# Altium footprint library 3.05-RJ11-RJ45-D_SUB-VGA-SCSI接口-网络变压器.PcbLib: 53 footprints (part 1 of 4)
Each footprint in its own frame and in the unit in brackets; x right, y up, seen from the top. Pads: shape width x height; smd on the part's side, far side on the other; paste and mask are expansions set on the pad; w line width, h text height; cw(c..) or ccw(c..) is an arc to the next point about the centre after c.
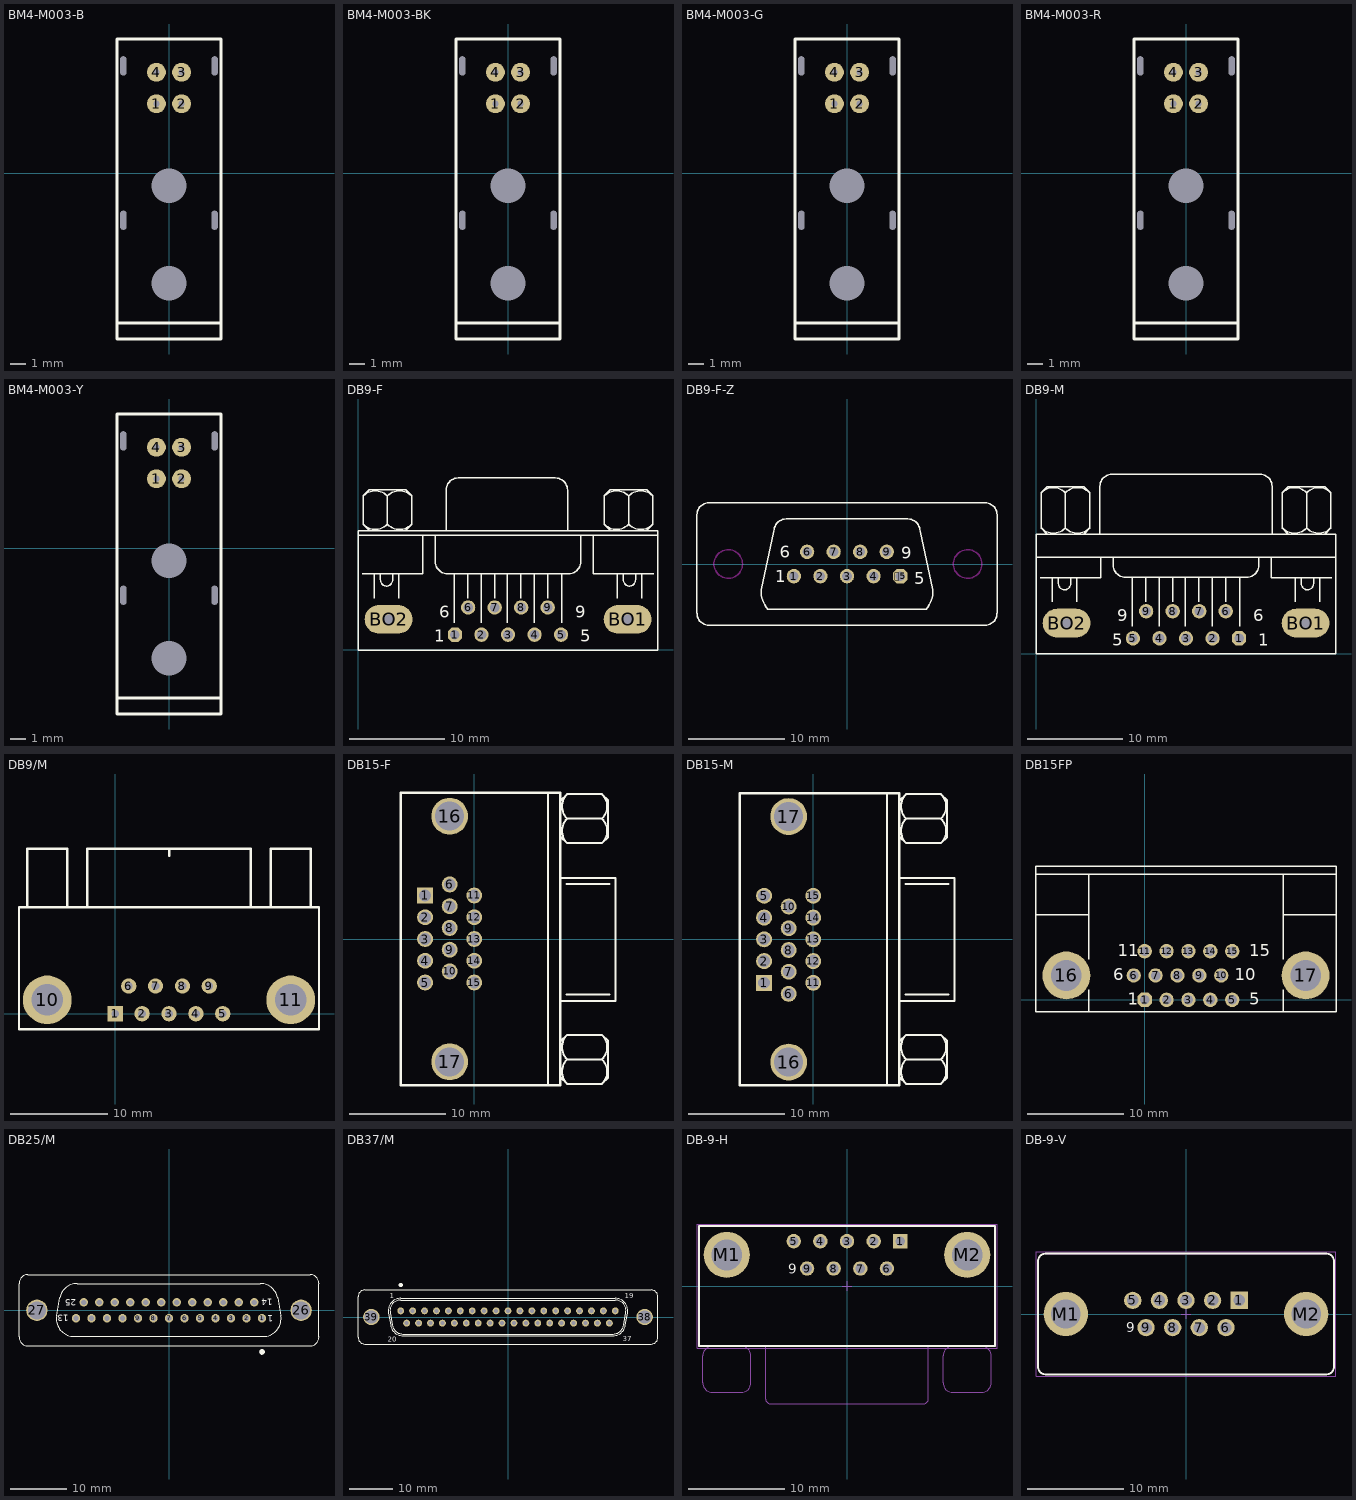
[diagram p0: the footprints below, top view; thin cyan lines are the x and y axes]

## BM4-M003-B [mm] "宝马头板端弯头（蓝色）"
pads (10):
  round 0 hole 0.4 slot 1.2 at 90 deg unplated: 0(-2.9,-3) 0(-2.9,6.8) 0(2.9,-3) 0(2.9,6.8)
  round 0 hole 2.2 unplated: 0(0,-7) 0(0,-0.8)
  round 1.2 hole 0.4: 1(-0.8,4.4) 2(0.8,4.4) 3(0.8,6.4) 4(-0.8,6.4)
Top Overlay:
  lines w0.203: -3.302,-9.525 3.302,-9.525 ; -3.302,-10.541 3.302,-10.541 3.302,8.509 -3.302,8.509 -3.302,-10.541
3D body: height 6.65, standoff -2.15, extent -3.1,-10.45 3.1,8.45

## BM4-M003-BK [mm] "宝马头板端弯头（黑色）淘宝ID:黄晶宝石"
pads (10):
  round 0 hole 0.4 slot 1.2 at 90 deg unplated: 0(-2.9,-3) 0(-2.9,6.8) 0(2.9,-3) 0(2.9,6.8)
  round 0 hole 2.2 unplated: 0(0,-7) 0(0,-0.8)
  round 1.2 hole 0.4: 1(-0.8,4.4) 2(0.8,4.4) 3(0.8,6.4) 4(-0.8,6.4)
Top Overlay:
  lines w0.203: -3.302,-9.525 3.302,-9.525 ; -3.302,-10.541 -3.302,8.509 3.302,8.509 3.302,-10.541 -3.302,-10.541
3D body: height 6.65, standoff -2.15, extent -3.1,-10.45 3.1,8.45

## BM4-M003-G [mm] "宝马头板端弯头（绿色）"
pads (10):
  round 0 hole 0.4 slot 1.2 at 90 deg unplated: 0(-2.9,-3) 0(-2.9,6.8) 0(2.9,-3) 0(2.9,6.8)
  round 0 hole 2.2 unplated: 0(0,-7) 0(0,-0.8)
  round 1.2 hole 0.4: 1(-0.8,4.4) 2(0.8,4.4) 3(0.8,6.4) 4(-0.8,6.4)
Top Overlay:
  lines w0.203: -3.302,-9.525 3.302,-9.525 ; -3.302,-10.541 3.302,-10.541 3.302,8.509 -3.302,8.509 -3.302,-10.541
3D body: height 6.65, standoff -2.15, extent -3.1,-10.45 3.1,8.45

## BM4-M003-R [mm] "宝马头板端弯头（红色） 淘宝ID:黄晶宝石"
pads (10):
  round 0 hole 0.4 slot 1.2 at 90 deg unplated: 0(-2.9,-3) 0(-2.9,6.8) 0(2.9,-3) 0(2.9,6.8)
  round 0 hole 2.2 unplated: 0(0,-7) 0(0,-0.8)
  round 1.2 hole 0.4: 1(-0.8,4.4) 2(0.8,4.4) 3(0.8,6.4) 4(-0.8,6.4)
Top Overlay:
  lines w0.203: -3.302,-9.525 3.302,-9.525 ; -3.302,-10.541 -3.302,8.509 3.302,8.509 3.302,-10.541 -3.302,-10.541
3D body: height 6.65, standoff -2.15, extent -3.1,-10.45 3.1,8.45

## BM4-M003-Y [mm] "宝马头板端弯头（黄色）"
pads (10):
  round 0 hole 0.4 slot 1.2 at 90 deg unplated: 0(-2.9,-3) 0(-2.9,6.8) 0(2.9,-3) 0(2.9,6.8)
  round 0 hole 2.2 unplated: 0(0,-7) 0(0,-0.8)
  round 1.2 hole 0.4: 1(-0.8,4.4) 2(0.8,4.4) 3(0.8,6.4) 4(-0.8,6.4)
Top Overlay:
  lines w0.203: -3.302,-9.525 3.302,-9.525 ; -3.302,-10.541 -3.302,8.509 3.302,8.509 3.302,-10.541 -3.302,-10.541
3D body: height 6.65, standoff -2.15, extent -3.1,-10.45 3.1,8.45

## DB9-F [mm]
pads (11):
  oct 1.5x1.5 hole 1: 1(10.092,1.6)
  round 1.5 hole 1: 2(12.865,1.6) 3(15.638,1.6) 4(18.411,1.6) 5(21.184,1.6) 6(11.468,4.44) 7(14.241,4.44) 8(17.014,4.44) 9(19.787,4.44)
  oval 5x3 hole 1: BO1(28.147,3.2) BO2(3.15,3.2)
Top Overlay:
  lines w0.15: -0.025,11.975 31.301,11.975 ; 0.398,7.95 6.748,7.95 6.748,11.975 ; 0.48,13.138 ccw(c1.753,14.41) 3.025,13.138 ; 0.48,16.106 cw(c1.753,14.834) 3.025,16.106 ; 1.118,12.505 0.483,13.14 0.483,16.104 1.118,16.739 4.928,16.739 5.563,16.104 ; 1.668,5.41 1.668,7.95 ; 2.303,7.95 2.303,7.315 ccw(c2.938,7.315) 3.573,7.315 3.573,7.95 ; 3.018,16.1 3.023,13.14 ; 3.02,13.138 ccw(c4.293,14.41) 5.565,13.138 ; 3.02,16.106 cw(c4.293,14.834) 5.565,16.106 5.563,13.14 4.928,12.505 ; 4.208,5.41 4.208,7.95 ; 8.018,9.271 8.018,11.975 ; 8.043,9.246 ccw(c9.313,9.246) 9.313,7.976 ; 9.161,12.497 9.161,16.764 ; 9.161,16.713 cw(c10.431,16.713) 10.431,17.983 ; 9.288,7.975 21.988,7.975 ; 10.033,2.87 10.033,7.975 ; 10.431,18 20.591,18 ; 11.438,5.41 11.438,7.975 ; 12.835,2.87 12.835,7.975 ; 14.241,5.41 14.241,7.975 ; 15.562,2.87 15.562,7.975 ; 16.993,5.41 16.993,7.975 ; 18.39,2.87 18.39,7.975 ; 19.77,5.41 19.77,7.975 ; 20.591,17.983 cw(c20.591,16.713) 21.861,16.713 ; 21.243,2.87 21.243,7.975 ; 21.861,12.497 21.861,16.764 ; 21.988,7.976 ccw(c21.988,9.246) 23.258,9.246 ; 23.258,9.22 23.258,11.975 ; 24.528,11.975 24.528,7.95 30.878,7.95 ; 25.711,13.138 ccw(c26.983,14.41) 28.255,13.138 ; 25.713,16.104 26.348,16.739 30.158,16.739 30.793,16.104 30.793,13.14 30.158,12.505 ; 26.348,12.505 25.713,13.14 25.711,16.106 cw(c26.983,14.834) 28.255,16.106 ; 27.068,5.41 27.068,7.95 ; 27.703,7.95 27.703,7.315 ccw(c28.338,7.315) 28.973,7.315 28.973,7.95 ; 28.251,13.138 ccw(c29.523,14.41) 30.795,13.138 ; 28.251,16.106 cw(c29.523,14.834) 30.795,16.106 ; 28.253,13.14 28.258,16.1 ; 29.608,5.41 29.608,7.95 ; -0.025,-0.025 31.301,-0.025 31.301,12.475 -0.025,12.475 -0.025,-0.025
  text "6" at 8.441,3.378 h1.27
  text "1" at 7.933,0.838 h1.27
  text "5" at 23.173,0.838 h1.27
  text "9" at 22.665,3.378 h1.27
Keep-Out Layer:
  lines w1: 1.65,3.2 4.65,3.2 ; 26.647,3.2 29.647,3.2
3D body: height 12.6, standoff -4, extent 0.238,0.03 31.038,17.93

## DB9-F-Z [mm]
pads (9):
  round 1.5 hole 1: 1(-5.546,-1.27) 2(-2.773,-1.27) 3(0,-1.27) 4(2.773,-1.27) 6(-4.17,1.27) 7(-1.397,1.27) 8(1.376,1.27) 9(4.149,1.27)
  oct 1.5x1.5 hole 1: 5(5.546,-1.27)
Top Overlay:
  lines w0.15: -15.663,-5.13 ccw(c-14.393,-5.13) -14.393,-6.4 14.393,-6.4 ccw(c14.393,-5.13) 15.663,-5.13 15.663,5.13 ccw(c14.393,5.13) 14.393,6.4 -14.393,6.4 ccw(c-14.393,5.13) -15.663,5.13 -15.663,-5.13 ; -8.953,-3.003 ccw(c-6.553,-3.003) -8.25,-4.7 8.25,-4.7 ccw(c6.553,-3.003) 8.953,-3.003 8.953,-2.694 7.623,3.43 ccw(c6.353,3.43) 6.353,4.7 6.25,4.7 -6.25,4.7 -6.353,4.7 ccw(c-6.353,3.43) -7.623,3.43 -8.953,-2.694 -8.953,-3.003
  text "9" at 5.649,0.558 h1.27
  text "5" at 7.009,-2.115 h1.27
  text "1" at -7.506,-1.908 h1.27
  text "6" at -7.045,0.627 h1.27
Keep-Out Layer:
  circle w0.15: c-12.402,0 r1.5
  circle w0.15: c12.596,0 r1.5
3D body: height 12.8, standoff -4.1, extent -15.499,-6.2 15.499,6.2

## DB9-M [mm]
pads (11):
  oct 1.5x1.5 hole 1: 1(21.209,1.626)
  round 1.5 hole 1: 2(18.436,1.626) 3(15.663,1.626) 4(12.89,1.626) 5(10.118,1.626) 6(19.812,4.466) 7(17.039,4.466) 8(14.266,4.466) 9(11.493,4.466)
  oval 5x3 hole 1: BO1(28.173,3.225) BO2(3.175,3.225)
Top Overlay:
  lines w0.15: 0,10.1 31.327,10.1 ; 0.423,7.976 6.773,7.976 6.773,10.1 ; 0.506,13.163 ccw(c1.778,14.436) 3.05,13.163 ; 0.506,16.867 cw(c1.778,15.595) 3.05,16.867 ; 1.143,12.531 0.508,13.166 0.508,16.865 1.143,17.5 4.953,17.5 5.588,16.865 ; 1.693,5.436 1.693,7.976 ; 2.328,7.976 2.328,7.341 ccw(c2.963,7.341) 3.598,7.341 3.598,7.976 ; 3.043,16.867 3.048,13.166 ; 3.046,13.163 ccw(c4.318,14.436) 5.59,13.163 ; 3.046,16.867 cw(c4.318,15.595) 5.59,16.867 ; 4.233,5.436 4.233,7.976 ; 4.953,12.531 5.588,13.166 5.591,16.865 ; 6.663,12.5 6.663,17.53 cw(c7.933,17.53) 7.933,18.8 23.393,18.8 cw(c23.393,17.53) 24.663,17.53 24.663,12.5 ; 8.043,9.296 8.043,10.1 ; 8.069,9.271 ccw(c9.339,9.271) 9.339,8.001 ; 9.313,8 22.013,8 ; 10.058,2.896 10.058,8 ; 11.464,5.436 11.464,8 ; 12.861,2.896 12.861,8 ; 14.266,5.436 14.266,8 ; 15.587,2.896 15.587,8 ; 17.018,5.436 17.018,8 ; 18.415,2.896 18.415,8 ; 19.795,5.436 19.795,8 ; 21.268,2.896 21.268,8 ; 22.013,8.001 ccw(c22.013,9.271) 23.283,9.271 ; 23.283,9.246 23.283,10.1 ; 24.553,10.1 24.553,7.976 30.903,7.976 ; 25.736,16.865 25.739,13.166 26.374,12.531 ; 25.736,13.163 ccw(c27.009,14.436) 28.281,13.163 ; 25.736,16.867 cw(c27.009,15.595) 28.281,16.867 ; 25.739,16.865 26.374,17.5 30.184,17.5 30.819,16.865 30.819,13.166 30.184,12.531 ; 27.093,5.436 27.093,7.976 ; 27.728,7.976 27.728,7.341 ccw(c28.363,7.341) 28.998,7.341 28.998,7.976 ; 28.276,13.163 ccw(c29.549,14.436) 30.821,13.163 ; 28.276,16.867 cw(c29.549,15.595) 30.821,16.867 ; 28.279,13.166 28.284,16.867 ; 29.633,5.436 29.633,7.976 ; 0,0 31.327,0 31.327,12.5 0,12.5 0,0
  text "9" at 8.467,3.404 h1.27
  text "5" at 7.959,0.864 h1.27
  text "1" at 23.199,0.864 h1.27
  text "6" at 22.691,3.404 h1.27
Keep-Out Layer:
  lines w1: 1.675,3.225 4.675,3.225 ; 26.673,3.225 29.673,3.225
3D body: height 12.6, standoff -4, extent 0.231,-0.004 31.031,20.496

## DB9/M [mm]
pads (11):
  rect 1.575x1.575 hole 0.8: 1(0,0)
  round 1.575 hole 0.8: 2(2.76,0) 3(5.52,0) 4(8.28,0) 5(11.04,0) 6(1.38,2.84) 7(4.14,2.84) 8(6.9,2.84) 9(9.66,2.84)
  round 5 hole 3.25: 10(-6.98,1.42) 11(18.02,1.42)
Top Overlay:
  lines w0.254: -9.05,10.92 -9.05,16.92 -4.94,16.92 ; -4.91,10.92 -4.91,16.92 ; -2.85,10.92 -2.85,16.92 13.9,16.92 13.9,10.92 ; 5.525,16.2 5.525,16.9 ; 15.95,10.92 15.95,16.92 20.06,16.92 ; 20.09,10.92 20.09,16.92 ; -9.88,-1.58 20.92,-1.58 20.92,10.92 -9.88,10.92 -9.88,-1.58
3D body: height 12.81, standoff -2.91, extent -9.925,-2.012 20.885,17.063

## DB15-F [mil] "VGAĸ"
height 393.7
pads (17):
  rect 65x65 hole 48: 1(-200,177.16)
  round 65 hole 48: 2(-200,88.58) 3(-200,0) 4(-200,-88.58) 5(-200,-177.16) 6(-100,222.17) 7(-100,133.58) 8(-100,45) 9(-100,-43.58) 10(-100,-132.16) 11(0,177.16) 12(0,88.58) 13(0,0) 14(0,-88.58) 15(0,-177.16)
  round 150 hole 118.11: 16(-100,500) 17(-100,-500)
Top Overlay:
  lines w8: 300,-595 300,596.25 ; 350,-251.67 575,-251.67 575,248.33 350,248.33 ; 353.33,-565 378.33,-590 520,-590 545,-565 545,-415 520,-390 378.33,-390 353.33,-415 ; 353.33,415 378.33,390 520,390 545,415 545,565 520,590 378.33,590 353.33,565 ; 375,-226.67 550,-226.67 ; 375,223.33 550,223.33 ; 378.25,-590.09 cw(c428.33,-540) 378.25,-489.91 ; 378.25,-490.09 cw(c428.33,-440) 378.25,-389.91 ; 378.25,389.91 cw(c428.33,440) 378.25,490.09 ; 378.25,489.91 cw(c428.33,540) 378.25,590.09 ; 378.33,-490 520,-490 ; 378.33,490 520,490 ; 520.09,-590.09 ccw(c470,-540) 520.09,-489.91 ; 520.09,-490.09 ccw(c470,-440) 520.09,-389.91 ; 520.09,389.91 ccw(c470,440) 520.09,490.09 ; 520.09,489.91 ccw(c470,540) 520.09,590.09
  lines w10: -300,-595 350,-595 350,595 -300,595 -300,-595
3D body: height 502.95, standoff -128.94, extent -230,-596.5 600.71,616.5

## DB15-M [mil] "VGA公"
height 393.7
pads (17):
  rect 65x65 hole 48: 1(-200,-177.16)
  round 65 hole 48: 2(-200,-88.58) 3(-200,0) 4(-200,88.58) 5(-200,177.16) 6(-100,-222) 7(-100,-132.16) 8(-100,-43.58) 9(-100,45) 10(-100,133.58) 11(0,-177.16) 12(0,-88.58) 13(0,0) 14(0,88.58) 15(0,177.16)
  round 150 hole 118.11: 16(-100,-500) 17(-100,500)
Top Overlay:
  lines w8: 300,-596.25 300,595 ; 350,-250.42 575,-250.42 575,249.58 350,249.58 ; 353.33,-563.75 378.33,-588.75 520,-588.75 545,-563.75 545,-413.75 520,-388.75 378.33,-388.75 353.33,-413.75 ; 353.33,416.25 378.33,391.25 520,391.25 545,416.25 545,566.25 520,591.25 378.33,591.25 353.33,566.25 ; 375,-225.42 550,-225.42 ; 375,224.58 550,224.58 ; 378.25,-588.84 cw(c428.33,-538.75) 378.25,-488.66 ; 378.25,-488.84 cw(c428.33,-438.75) 378.25,-388.66 ; 378.25,391.16 cw(c428.33,441.25) 378.25,491.34 ; 378.25,491.16 cw(c428.33,541.25) 378.25,591.34 ; 378.33,-488.75 520,-488.75 ; 378.33,491.25 520,491.25 ; 520.09,-588.84 ccw(c470,-538.75) 520.09,-488.66 ; 520.09,-488.84 ccw(c470,-438.75) 520.09,-388.66 ; 520.09,391.16 ccw(c470,441.25) 520.09,491.34 ; 520.09,491.16 ccw(c470,541.25) 520.09,591.34
  lines w10: -300,-595 -300,595 350,595 350,-595 -300,-595

## DB15FP [mm]
pads (17):
  oct 1.5x1.5 hole 1: 1(0.005,0.007)
  round 1.5 hole 1: 2(2.291,0.007) 3(4.577,0.007) 4(6.863,0.007) 5(9.149,0.007) 6(-1.138,2.547) 7(1.148,2.547) 8(3.434,2.547) 9(5.72,2.547) 10(8.006,2.547) 11(0.005,5.087) 12(2.291,5.087) 13(4.577,5.087) 14(6.863,5.087) 15(9.149,5.087)
  round 5 hole 3.2: 16(-8.165,2.547) 17(16.812,2.547)
Top Overlay:
  lines w0.15: -11.34,8.897 -5.837,8.897 ; -11.34,13.13 19.987,13.13 ; -5.837,-1.263 -5.837,1.065 ; -5.837,4.24 -5.837,8.897 ; -5.837,13.13 -5.837,8.897 ; 14.483,-1.263 14.483,1.065 ; 14.483,4.24 14.483,8.897 ; 14.483,13.13 14.483,8.897 ; 19.987,8.897 14.483,8.897 ; -11.34,-1.263 -11.34,13.977 19.987,13.977 19.987,-1.263 -11.34,-1.263
  text "5" at 10.927,-0.501 h1.27
  text "10" at 9.403,2.039 h1.27
  text "15" at 10.927,4.579 h1.27
  text "11" at -2.789,4.579 h1.27
  text "6" at -3.297,2.039 h1.27
  text "1" at -1.773,-0.501 h1.27
3D body: height 12.27, standoff -3.77, extent -11.082,-0.854 19.728,20.246

## DB25/M [mm] "Straight D-SUB 25 Male Contacts for PCB  with Harpoons and Female Screwlock (UNC4-40) and Elec. Continuity"
height 12.05
pads (27):
  round 1.5 hole 0.9: 1(16.56,-1.42) 2(13.8,-1.42) 3(11.04,-1.42) 4(8.28,-1.42) 5(5.52,-1.42) 6(2.76,-1.42) 7(0,-1.42) 8(-2.76,-1.42) 9(-5.52,-1.42) 10(-8.28,-1.42) 11(-11.04,-1.42) 12(-13.8,-1.42) 13(-16.56,-1.42) 14(15.18,1.42) 15(12.42,1.42) 16(9.66,1.42) 17(6.9,1.42) 18(4.14,1.42) 19(1.38,1.42) 20(-1.38,1.42) 21(-4.14,1.42) 22(-6.9,1.42) 23(-9.66,1.42) 24(-12.42,1.42) 25(-15.18,1.42)
  round 3.8 hole 3.2: 26(23.52,0) 27(-23.52,0)
Top Overlay:
  circle w0.5: c16.56,-7.42 r0.25
  lines w0.2: -26.705,-4.75 ccw(c-25.105,-4.75) -25.105,-6.35 25.105,-6.35 ccw(c25.105,-4.75) 26.705,-4.75 26.705,4.75 ccw(c25.105,4.75) 25.105,6.35 -25.105,6.35 ccw(c-25.105,4.75) -26.705,4.75 -26.705,-4.75 ; -20.003,-0.978 ccw(c-16.93,-1.52) -16.93,-4.64 16.83,-4.64 ccw(c16.83,-1.52) 19.903,-0.978 19.344,2.192 ccw(c16.271,1.65) 16.271,4.77 -16.371,4.77 ccw(c-16.371,1.65) -19.444,2.192 -20.003,-0.978
  text "14" at 18.475,2.05 h1.2
  text "13" at -17.825,-0.825 h1.2
  text "1" at 18.575,-0.85 h1.2
  text "25" at -16.55,1.925 h1.2
3D body: height 12.1, standoff -2.9, extent -26.52,-6.275 26.52,6.275

## DB37/M [mm] "Straight D-SUB 37 Male Contacts for PCB  with Harpoons and Female Screwlock (UNC4-40) and Elec. Continuity联系卖家免费查找封装"
height 12.05
pads (39):
  round 1.6 hole 0.9: 1(-24.93,1.42) 2(-22.16,1.42) 3(-19.39,1.42) 4(-16.62,1.42) 5(-13.85,1.42) 6(-11.08,1.42) 7(-8.31,1.42) 8(-5.54,1.42) 9(-2.77,1.42) 10(0,1.42) 11(2.77,1.42) 12(5.54,1.42) 13(8.31,1.42) 14(11.08,1.42) 15(13.85,1.42) 16(16.62,1.42) 17(19.39,1.42) 18(22.16,1.42) 19(24.93,1.42) 20(-23.545,-1.42) 21(-20.775,-1.42) 22(-18.005,-1.42) 23(-15.235,-1.42) 24(-12.465,-1.42) 25(-9.695,-1.42) 26(-6.925,-1.42) 27(-4.155,-1.42) 28(-1.385,-1.42) 29(1.385,-1.42) 30(4.155,-1.42) 31(6.925,-1.42) 32(9.695,-1.42) 33(12.465,-1.42) 34(15.235,-1.42) 35(18.005,-1.42) 36(20.775,-1.42) 37(23.545,-1.42)
  round 3.8 hole 3.1: 38(31.75,0) 39(-31.75,0)
Top Overlay:
  circle w0.5: c-24.93,7.42 r0.25
  lines w0.2: -34.85,-4.675 ccw(c-33.25,-4.675) -33.25,-6.275 33.25,-6.275 ccw(c33.25,-4.675) 34.85,-4.675 34.85,4.675 ccw(c33.25,4.675) 33.25,6.275 -33.25,6.275 ccw(c-33.25,4.675) -34.85,4.675 -34.85,-4.675 ; -27.776,0.946 cw(c-24.92,1.45) -24.92,4.35 24.92,4.35 cw(c24.92,1.45) 27.776,0.946 27.265,-1.954 cw(c24.409,-1.45) 24.409,-4.35 -24.409,-4.35 cw(c-24.409,-1.45) -27.265,-1.954 -27.776,0.946 ; -27.382,1.016 cw(c-24.92,1.45) -24.92,3.95 24.92,3.95 cw(c24.92,1.45) 27.382,1.016 26.871,-1.884 cw(c24.409,-1.45) 24.409,-3.95 -24.409,-3.95 cw(c-24.409,-1.45) -26.871,-1.884 -27.382,1.016
  text "20" at -27.97,-5.692 h1.2
  text "1" at -27.475,4.393 h1.2
  text "19" at 27.093,4.393 h1.2
  text "37" at 26.609,-5.64 h1.2
3D body: height 12, standoff -3.2, extent -34.85,-6.275 34.85,6.275

## DB-9-H [mm] "9 pins, right angled, 8.08mm, with hex screw"
height 12.5
pads (11):
  rect 1.5x1.5 hole 1: 1(5.54,4.67)
  round 1.5 hole 1: 2(2.77,4.67) 3(0,4.67) 4(-2.77,4.67) 5(-5.54,4.67) 6(4.155,1.83) 7(1.385,1.83) 8(-1.385,1.83) 9(-4.155,1.83)
  round 4.8 hole 3.2: M1(-12.5,3.25) M2(12.5,3.25)
Top Overlay:
  lines w0.2: -15.4,-6.25 -15.4,6.25 15.4,6.25 15.4,-6.25 -15.4,-6.25
  text "9" at -6.1,1.3 h1.02
Mechanical 2:
  lines w0.1: -15.4,-6.17 15.4,-6.17
  text "PCB Edge" at -3.5,-7.57 h1.02
Mechanical 13:
  lines w0.1: -14,-6.25 ccw(c-14,-7.25) -15,-7.25 -15,-10.05 ccw(c-14,-10.05) -14,-11.05 -11,-11.05 ccw(c-11,-10.05) -10,-10.05 -10,-7.25 ccw(c-11,-7.25) -11,-6.25 ; -8.45,-6.25 -8.45,-11.75 ccw(c-7.95,-11.75) -7.95,-12.25 7.95,-12.25 ; 8.45,-6.25 8.45,-11.75 cw(c7.95,-11.75) 7.95,-12.25 ; 11,-6.25 ccw(c11,-7.25) 10,-7.25 10,-10.05 ccw(c11,-10.05) 11,-11.05 14,-11.05 ccw(c14,-10.05) 15,-10.05 15,-7.25 ccw(c14,-7.25) 14,-6.25 ; 7.95,-12.25 7.95,-12.25 ; -15.4,-6.25 15.4,-6.25 15.4,6.25 -15.4,6.25 -15.4,-6.25
Mechanical 15:
  lines w0.05: -0.5,0 0.5,0 ; 0,-0.5 0,0.5 ; -15.6,-6.45 -15.6,6.45 15.6,6.45 15.6,-6.45 -15.6,-6.45
3D body: height 12.65, standoff -3.16, extent -15.577,-12.802 15.323,5.698

## DB-9-V [mm] "Female 09p Straight With board clip & Hex screw UNC 4-40"
height 11
pads (11):
  rect 1.8x1.8 hole 1.2: 1(5.54,1.42)
  round 1.8 hole 1.2: 2(2.77,1.42) 3(0,1.42) 4(-2.77,1.42) 5(-5.54,1.42) 6(4.155,-1.42) 7(1.385,-1.42) 8(-1.385,-1.42) 9(-4.155,-1.42)
  round 4.6 hole 3.05: M1(-12.5,0) M2(12.5,0)
Top Overlay:
  lines w0.2: -15.405,-5.475 ccw(c-14.605,-5.475) -14.605,-6.275 14.605,-6.275 ccw(c14.605,-5.475) 15.405,-5.475 15.405,5.475 ccw(c14.605,5.475) 14.605,6.275 -14.605,6.275 ccw(c-14.605,5.475) -15.405,5.475 -15.405,-5.475
  text "9" at -6.2,-1.9 h1.02
Mechanical 13:
  lines w0.1: -15.405,-5.475 ccw(c-14.605,-5.475) -14.605,-6.275 14.605,-6.275 ccw(c14.605,-5.475) 15.405,-5.475 15.405,5.475 ccw(c14.605,5.475) 14.605,6.275 -14.605,6.275 ccw(c-14.605,5.475) -15.405,5.475 -15.405,-5.475
Mechanical 15:
  lines w0.05: -0.5,0 0.5,0 ; 0,-0.5 0,0.5 ; -15.605,-6.475 -15.605,6.475 15.605,6.475 15.605,-6.475 -15.605,-6.475
3D body: height 12.9, standoff -3.9, extent -15.4,-6.275 15.4,6.275